# Altium schematic symbol library Altium_Lib.SchLib: 403 symbols (part 3 of 4) (continued)
## NUP4202W1T2G (continued)
TVS DIODE 5VWM 14.5VC SOT363; Manufacturer: ON Semiconductor; Capacitance @ Frequency: 3pF @ 1MHz; Voltage - Reverse Standoff (Typ): 5V (Max); Voltage - Breakdown (Min): 6V; Power Line Protection: No; Current - Peak Pulse (10/1000µs): 28A (8/20µs); Power - Peak Pulse: 500W; Voltage - Clamping (Max) @ Ipp: 14.5V (Typ); Type: Steering (Rail to Rail); Operating Temperature: -40°C ~ 125°C (TJ); Supplier: Digi-Key; Applications: General Purpose; Manufacturer Part Number: NUP4202W1T2G; Packaging: Cut Tape (CT); Package / Case: 6-TSSOP, SC-88, SOT-363; Mounting Type: Surface Mount; RoHS: RoHS Compliant; Category: Circuit Protection; Supplier Device Package: SC-88/SC70-6/SOT-363; Part Status: Active; ComponentLink1URL: http://www.onsemi.com/pub_link/Collateral/NUP4202W1-D.PDF; ComponentLink1Description: http://www.onsemi.com/pub_link/Collateral/NUP4202W1-D.PDF; Pricing: 1=0.69, 10=0.595, 100=0.4441, 500=0.34896, 1000=0.26965 (USD); Stock: 8683; Supplier Part Number: NUP4202W1T2GOSCT-ND
footprint SOT-363
pins: 1, 2, 3, 4, 5, 6

## NX4024T032
designator D?
Generic 3.2" HMI LCD Touch Display 4MB Flash; Manufacturer: Nextion; Manufacturer Part Number: NX4024T032
footprint NX4024T032

## PAD_Inductor_2X_3mmX1mm
designator P?, comment Inductor_Pad  (no BOM)
Inductor Solder pad 2x 1mm X 3mm; Manufacturer: *; Manufacturer Part Number: *; Mounting Type: Surface Mount
footprint PAD_Inductor_2X_3mmX1mm
pins: 1, 2

## PAD_Inductor_2X_5mmx1.75mm
designator P?, comment Inductor_Pad  (no BOM)
Inductor Solder pad 2X 50mmX33mm,; Manufacturer: *; Manufacturer Part Number: *; Mounting Type: Surface Mount
footprint PAD_Inductor_2X_5mmx1.75mm
pins: 1, 2

## PCA9517DP,118
designator U?
IC REDRIVER I2C 1CH 8TSSOP; Manufacturer: NXP USA Inc.; Output: 2-Wire Bus; Number of Channels: 2; Current - Supply: 5mA; Data Rate (Max): 400kHz; Voltage - Supply: 2.7 V ~ 5.5 V; Operating Temperature: -40°C ~ 85°C; Package / Case: 8-TSSOP, 8-MSOP (0.118", 3.00mm Width); Category: Integrated Circuits (ICs); Type: Buffer, ReDriver; Base Part Number: PCA9517; Manufacturer Part Number: PCA9517DP,118; Applications: I²C; Input: 2-Wire Bus; Supplier Device Package: 8-TSSOP; Packaging: Cut Tape (CT); Part Status: Active; Delay Time: -; Supplier: Digi-Key; Signal Conditioning: -; RoHS: RoHS Compliant; ComponentLink1URL: https://www.nxp.com/docs/en/data-sheet/PCA9517.pdf; ComponentLink1Description: https://www.nxp.com/docs/en/data-sheet/PCA9517.pdf; Pricing: 1=1.4, 10=1.265, 100=1.008, 500=0.8499, 1000=0.6918 (USD); Supplier Part Number: 568-1829-1-ND
footprint TSSOP-8
pins: 1 VCCA (power) "A-side supplyVoltage (0.9V to 5.5V)", 2 SCLA (io) "Serial clock bus, A side. Connect to VCCA  through a pullup resistor.", 3 SDAA (io) "Serial data bus, A side. Connect to VCCA  through a pullup resistor.", 4 GND (power) "Supply ground", 5 EN (in) "Active-high repeater enable input", 6 SDAB (io) "Serial data bus, B side. Connect toVCBB   through a pullup resistor.", 7 SCLB (io) "Serial clock bus, B side. Connect to VCCB through a pullup resistor.", 8 VCCB (power) "B-side and device supplyVoltage (2.7V to 5.5V)"

## PCA9617ADPJ
designator U?
IC REDRIVER I2C 1CH 1MHZ 8TSSOP; Manufacturer: NXP USA Inc.; Input: 2-Wire Bus; Number of Channels: 1; Voltage - Supply: 2.7 V ~ 5.5 V; Current - Supply: 8µA; Supplier 1: Digi-Key; Manufacturer Part Number: PCA9617ADPJ; RoHS: RoHS Compliant; Category: Integrated Circuits (ICs); Stock 1: 12305; Pricing 1: 1=1.12, 10=1.003, 100=0.782, 500=0.64596, 1000=0.50997 (USD); Packaging: Cut Tape (CT); Part Status: Active; Type: Buffer, ReDriver; Applications: I²C; Output: 2-Wire Bus; Data Rate (Max): 1MHz; Delay Time: -; Signal Conditioning: -; Operating Temperature: -40°C ~ 85°C; Package / Case: 8-TSSOP, 8-MSOP (0.118", 3.00mm Width); Supplier Device Package: 8-TSSOP; Base Part Number: PCA9617; ComponentLink1URL: https://www.nxp.com/docs/en/data-sheet/PCA9617A.pdf; ComponentLink1Description: https://www.nxp.com/docs/en/data-sheet/PCA9617A.pdf; Supplier Part Number 1: 568-10211-1-ND
footprint TSSOP-8 - S
pins: 1 VCCA (power) "A-side supplyVoltage (0.9V to 5.5V)", 2 SCLA (io) "Serial clock bus, A side. Connect to VCCA  through a pullup resistor.", 3 SDAA (io) "Serial data bus, A side. Connect to VCCA  through a pullup resistor.", 4 GND (power) "Supply ground", 5 EN (in) "Active-high repeater enable input", 6 SDAB (io) "Serial data bus, B side. Connect toVCBB   through a pullup resistor.", 7 SCLB (io) "Serial clock bus, B side. Connect to VCCB through a pullup resistor.", 8 VCCB (power) "B-side and device supplyVoltage (2.7V to 5.5V)"

## PCT2075GV/P110X
designator U?
IC SENSOR TEMP I2C/SMBUS 6TSOP; Manufacturer: NXP USA Inc.; Sensor Type: Digital, Local; Sensing Temperature - Local: -55°C ~ 125°C; Output Type: I²C/SMBus; Voltage - Supply: 2.7 V ~ 5.5 V; Resolution: 11 b; Accuracy - Highest (Lowest): ±1°C (±2°C); Test Condition: -25°C ~ 100°C (-55°C ~ 125°C); Manufacturer Part Number: PCT2075GV/P110X; Category: Sensors, Transducers; Supplier: Digi-Key; RoHS: RoHS Compliant; Packaging: Tape & Reel (TR); Part Status: Active; Sensing Temperature - Remote: -; Features: Output Switch, Programmable Limit, Shutdown Mode; Operating Temperature: -55°C ~ 125°C; Mounting Type: Surface Mount; Package / Case: SC-74, SOT-457; Supplier Device Package: 6-TSOP; ComponentLink1URL: http://www.nxp.com/documents/data_sheet/PCT2075.pdf; ComponentLink1Description: http://www.nxp.com/documents/data_sheet/PCT2075.pdf; Pricing: 3000=0.261, 6000=0.243, 15000=0.2394 (USD); Supplier Part Number: 568-13081-2-ND
footprint TSOP-6 (SOT-23/SC-74A; 5 Leads; Body 3 x 3 mm, inc. leads (LxW max))
pins: 1 A0, 2 GND, 3 VCC, 4 SCL, 5 OS, 6 SDA

## PCT2075GVX
designator U?
IC SENSOR TEMP I2C/SMBUS 6TSOP; Manufacturer: NXP USA Inc.; Sensor Type: Digital, Local; Sensing Temperature - Local: -55°C ~ 125°C; Output Type: I²C/SMBus; Voltage - Supply: 2.7 V ~ 5.5 V; Resolution: 11 b; Accuracy - Highest (Lowest): ±1°C (±2°C); Test Condition: -25°C ~ 100°C (-55°C ~ 125°C); Manufacturer Part Number: PCT2075GVX; Category: Sensors, Transducers; Supplier: Digi-Key; RoHS: RoHS Compliant; Packaging: Tape & Reel (TR); Part Status: Active; Sensing Temperature - Remote: -; Features: Output Switch, Programmable Limit, Shutdown Mode; Operating Temperature: -55°C ~ 125°C; Mounting Type: Surface Mount; Package / Case: SC-74, SOT-457; Supplier Device Package: 6-TSOP; ComponentLink1URL: http://www.nxp.com/documents/data_sheet/PCT2075.pdf; ComponentLink1Description: http://www.nxp.com/documents/data_sheet/PCT2075.pdf; Pricing: 3000=0.261, 6000=0.243, 15000=0.2394 (USD); Supplier Part Number: 568-13081-2-ND
footprint TSOP-6 (SOT-23/SC-74A; 5 Leads; Body 3 x 3 mm, inc. leads (LxW max))
pins: 1 A0, 2 GND, 3 VCC, 4 SCL, 5 OS, 6 SDA

## PDI018A0P-SE3
designator U?
The PDI018A0P-SE3  is a small-size 1.77” TFT with 128 x 160  resolution; Manufacturer: Phoenix Display International, Inc; Manufacturer Part Number: PDI018A0P-SE3; ComponentLink1Description: http://www.phoenixdisplay.com/wp-content/uploads/2015/07/PDI018A0P-SE3.pdf
footprint PDI018A0P-SE3
pins: 1 GND, 2 GND, 3 NC, 4 GND, 5 IOVCC, 6 RST, 7 RS, 8 SCL, 9 SDI, 10 CS, 11 GND, 12 VDD, 13 LED_A, 14 LED_K1, 15 LED_K2, 16 GND

## PDTC143ZT,235
designator Q?
TRANS PREBIAS NPN 250MW TO236AB; Manufacturer: Nexperia USA Inc.; Transistor Type: NPN - Pre-Biased; Current - Collector (Ic) (Max): 100mA; Voltage - Collector Emitter Breakdown (Max): 50V; Resistor - Base (R1) (Ohms): 4.7k; Resistor - Emitter Base (R2) (Ohms): 47k; DC Current Gain (hFE) (Min) @ Ic, Vce: 100 @ 10mA, 5V; Vce Saturation (Max) @ Ib, Ic: 100mV @ 250µA, 5mA; Current - Collector Cutoff (Max): 1µA; Frequency - Transition: 230MHz; Manufacturer Part Number: PDTC143ZT,235; Category: Discrete Semiconductor Products; Supplier: Digi-Key; RoHS: RoHS Compliant; Packaging: Tape & Reel (TR); Part Status: Active; Power - Max: 250mW; Mounting Type: Surface Mount; Package / Case: TO-236-3, SC-59, SOT-23-3; Supplier Device Package: TO-236AB (SOT23); ComponentLink1URL: http://assets.nexperia.com/documents/data-sheet/PDTC143Z_SER.pdf; ComponentLink1Description: http://assets.nexperia.com/documents/data-sheet/PDTC143Z_SER.pdf; Pricing: 10000=0.02478, 30000=0.0223, 50000=0.01982, 100000=0.01859, 250000=0.01652 (USD); Supplier Part Number: 1727-3045-2-ND
footprint SOT23_L (SOT23, 3-Leads, Body 2.9x1.3mm, Pitch 0.95mm, Lead Span 2.3mm, IPC High Density)
pins: 1 B, 2 E, 3 C
text: 4K7; 47K

## PIC16F1823T-I/SL
designator U?
IC MCU 8BIT 3.5KB FLASH 14SOIC; Manufacturer: Microchip Technology; Oscillator Type: Internal; RAM Size: 128 x 8; Data Converters: A/D 8x10b; Voltage - Supply (Vcc/Vdd): 1.8 V ~ 5.5 V; EEPROM Size: 256 x 8; Connectivity: I²C, LIN, SPI, UART/USART; Core Size: 8-Bit; Speed: 32MHz; Core Processor: PIC; Peripherals: Brown-out Detect/Reset, POR, PWM, WDT; Program Memory Size: 3.5KB (2K x 14); Package / Case: 14-SOIC (0.154", 3.90mm Width); Supplier Device Package: 14-SOIC; Operating Temperature: -40°C ~ 85°C (TA); Supplier: Digi-Key; Category: Integrated Circuits (ICs); Part Status: Active; Program Memory Type: FLASH; Manufacturer Part Number: PIC16F1823T-I/SL; Packaging: Tape & Reel (TR); RoHS: RoHS Compliant; ComponentLink1URL: http://www.microchip.com/mymicrochip/filehandler.aspx?ddocname=en547368; ComponentLink1Description: http://www.microchip.com/mymicrochip/filehandler.aspx?ddocname=en547368; Pricing: 2600=0.987 (USD); Supplier Part Number: PIC16F1823T-I/SLTR-ND
footprint SOIC-14_M (SOIC, 14-Leads, Body 8.7x3.9mm, Pitch 1.27mm, IPC Low Density)
pins: 1 VDD, 2 RA5/T1CKI/OSC1/CLKIN, 3 RA4/AN3/T1G/OSC2/CLKOUT, 4 RA3/MCLR/VPP, 5 RC5/CCP1/P1A, 6 RC4/C2OUT/P1B, 7 RC3/AN7/C12IN3, 8 RC2/AN6/C12IN2-/P1d, 9 RC1/AN5/C12IN1-, 10 RC0/AN4/C2IN+, 11 RA2/AN2/TOCKI/INT/C1OUT, 12 RA1/AN1/C12IN0-/VREF/ICSPCLK, 13 RA0/AN0/C1IN+/ISCPDAT, 14 VSS

## PIC16F18323-E/SL
designator U?
IC MCU 8BIT 3.5KB FLASH 14SOIC; Manufacturer: Microchip Technology; Speed: 32MHz; Core Processor: PIC; Connectivity: I²C, LIN, SPI, UART/USART; Peripherals: Brown-out Detect/Reset, POR, PWM, WDT; Core Size: 8-Bit; Voltage - Supply (Vcc/Vdd): 2.3 V ~ 5.5 V; RAM Size: 256 x 8; Program Memory Size: 3.5KB (2K x 14); Oscillator Type: Internal; Data Converters: A/D 11x10b, D/A 1x5b; Number of I/O: 12; RoHS: RoHS Compliant; Part Status: Active; Packaging: Tube; Operating Temperature: -40°C ~ 125°C (TA); Program Memory Type: FLASH; Supplier: Digi-Key; Supplier Device Package: 14-SOIC; Package / Case: 14-SOIC (0.154", 3.90mm Width); Manufacturer Part Number: PIC16F18323-E/SL; EEPROM Size: 256 x 8; Category: Integrated Circuits (ICs); ComponentLink1URL: http://ww1.microchip.com/downloads/en/DeviceDoc/40001744C.pdf; ComponentLink1Description: http://ww1.microchip.com/downloads/en/DeviceDoc/40001744C.pdf; Pricing: 1=0.9, 25=0.824, 100=0.7416 (USD); Supplier Part Number: PIC16F18323-E/SL-ND
footprint SOIC-14_M (SOIC, 14-Leads, Body 8.7x3.9mm, Pitch 1.27mm, IPC Low Density)
pins: 1 VDD, 2 RA5/T1CKI/OSC1/CLKIN, 3 RA4/AN3/T1G/OSC2/CLKOUT, 4 RA3/MCLR/VPP, 5 RC5/CCP1/P1A, 6 RC4/C2OUT/P1B, 7 RC3/AN7/C12IN3, 8 RC2/AN6/C12IN2-/P1d, 9 RC1/AN5/C12IN1-, 10 RC0/AN4/C2IN+, 11 RA2/AN2/TOCKI/INT/C1OUT, 12 RA1/AN1/C12IN0-/VREF/ICSPCLK, 13 RA0/AN0/C1IN+/ISCPDAT, 14 VSS

## PIC16LF18323-I/SL
designator U?
IC MCU 8BIT 3.5KB FLASH 14SOIC; Manufacturer: Microchip Technology; Connectivity: I²C, LIN, SPI, UART/USART; RAM Size: 256 x 8; Speed: 32MHz; Voltage - Supply (Vcc/Vdd): 1.8 V ~ 3.6 V; Data Converters: A/D 11x10b, D/A 1x5b; Peripherals: Brown-out Detect/Reset, POR, PWM, WDT; Oscillator Type: Internal; Program Memory Size: 3.5KB (2K x 14); Core Processor: PIC; Core Size: 8-Bit; Package / Case: 14-SOIC (0.154", 3.90mm Width); Supplier Device Package: 14-SOIC; Program Memory Type: FLASH; EEPROM Size: 256 x 8; Operating Temperature: -40°C ~ 85°C (TA); RoHS: RoHS Compliant; Supplier: Digi-Key; Part Status: Active; Packaging: Tube; Category: Integrated Circuits (ICs); Manufacturer Part Number: PIC16LF18323-I/SL; ComponentLink1URL: http://ww1.microchip.com/downloads/en/DeviceDoc/40001744C.pdf; ComponentLink1Description: http://ww1.microchip.com/downloads/en/DeviceDoc/40001744C.pdf; Pricing: 1=0.83, 25=0.756, 100=0.693 (USD); Supplier Part Number: PIC16LF18323-I/SL-ND
footprint SOIC-14_M (SOIC, 14-Leads, Body 8.7x3.9mm, Pitch 1.27mm, IPC Low Density)
pins: 1 VDD, 2 RA5/T1CKI/OSC1/CLKIN, 3 RA4/AN3/T1G/OSC2/CLKOUT, 4 RA3/MCLR/VPP, 5 RC5/CCP1/P1A, 6 RC4/C2OUT/P1B, 7 RC3/AN7/C12IN3, 8 RC2/AN6/C12IN2-/P1d, 9 RC1/AN5/C12IN1-, 10 RC0/AN4/C2IN+, 11 RA2/AN2/TOCKI/INT/C1OUT, 12 RA1/AN1/C12IN0-/VREF/ICSPCLK, 13 RA0/AN0/C1IN+/ISCPDAT, 14 VSS

## PIC18F1320-I/SS
designator U?
IC MCU 8BIT 8KB FLASH 20SSOP; Manufacturer: Microchip Technology; Data RAM Size: 256 B; Data ROM Type: EEPROM; Interface Type: EUSART; Number of I/Os: 16 I/O; ADC Resolution: 10 bit; Core: PIC; Maximum Clock Frequency: 40 MHz; Number of ADC Channels: 7 Channel; Number of Timers/Counters: 1 Timer; Operating Supply Voltage: 2 V to 5.5 V; Processor Series: PIC18; Supply Voltage - Max: 5.5 V; Supply Voltage - Min: 4.2 V; Supplier 1: Mouser; Manufacturer Part Number: PIC18F1320-I/SS; RoHS: RoHS Compliant; Category: 8-bit Microcontrollers - MCU; Stock 1: 243; Pricing 1: 1=2.95 (USD); Height: 1.75 mm; Length: 7.2 mm; Package / Case: SSOP-20; Packaging: Tube; Program Memory Type: Flash; Series: PIC18(L)F1x20; Width: 5.3 mm; Brand: Microchip Technology; Data ROM Size: 256 B; Mounting Style: SMD/SMT; Program Memory Size: 8 kB; Data Bus Width: 8 bit; Maximum Operating Temperature: + 85 C; Minimum Operating Temperature: - 40 C; Product Type: 8-bit Microcontrollers - MCU; Standard Pack Qty: 67; Subcategory: Microcontrollers - MCU; Tradename: PIC; RoHS - Mouser: Y; Minimum Order Quantity: 1; Reeling: False; ComponentLink1URL: https://www.mouser.com/datasheet/2/268/30009605G-1074158.pdf; ComponentLink1Description: https://www.mouser.com/datasheet/2/268/30009605G-1074158.pdf; Supplier Part Number 1: 579-PIC18F1320-I/SS
footprint SSOP20
pins: 1 RA0/AN0, 2 RA1/AN1/LVDIN, 3 RA4/TOCKI, 4 MCLR/VPP/RA5, 5 VSS, 6 AVSS, 7 RA2/AN3/VREF-, 8 RA3/AN3/VREF+, 9 RB0/AN4/INT0, 10 RB1/AN5/TX/CK/INT1, 11 RB4/AN6/RX/DT/KBIO, 12 RB5/PGM/KBI1, 13 RB6/PGC/T1OSO, 14 RB7/PGD/T1oSI, 15 AVDD, 16 VDD, 17 OSC2/CLKO/RA6, 18 OSC1/CLKI/RA7, 19 RB2/P1B/INT2, 20 RB3/CCP1/P1A

## PIC18F2525-I/SO
designator U?
IC MCU 8BIT 48KB FLASH 28SOIC; Manufacturer: Microchip; RAM Size: 3986B; Max Power Dissipation: 1W; Interface: I2C,SPI,UART,USART; Number of I/Os: 25; Number of Timers/Counters: 4; Min Supply Voltage: 4.2V; Max Supply Voltage: 5.5V; Number of PWM Channels: 2; Number of ADC Channels: 10; Frequency: 40MHz; Number of UART Channels: 1; Data Bus Width: 8b; Number of Bits: 8; Oscillator Type: Internal; Watchdog Timer: Yes; Access Time: 40us; Peripherals: PWM,I2C,Brown-out Detect/Reset,POR,WDT,HLVD; Core Architecture: PIC; Nominal Supply Current: 1.1mA; Supplier 1: Digi-Key; Manufacturer Part Number: PIC18F2525-I/SO; Stock 1: 391; Pricing 1: 1=5.21 (USD); Mount: Surface Mount; Case/Package: SOIC; Number of Pins: 28; Min Operating Temperature: -40°C; Max Operating Temperature: 85°C; Package Quantity: 27; Packaging: Rail/Tube; Density: 48KB; Number of Programmable I/O: 25; Memory Type: FLASH; Max Frequency: 40MHz; Number of SPI Channels: 1; Number of I2C Channels: 1; Number of A/D Converters: 1; Memory Size: 48KB; Address Bus Width: 8b; Length: 17.9mm; Height: 2.35mm; Width: 7.5mm; Radiation Hardening: No; REACH SVHC: No SVHC; Lead Free: Lead Free; ComponentLink1URL: http://www.microchip.com/mymicrochip/filehandler.aspx?ddocname=en533963&src-supplier=Digi-Key; ComponentLink1Description: http://www.microchip.com/mymicrochip/filehandler.aspx?ddocname=en533963&src-supplier=Digi-Key; ComponentLink2URL: http://ww1.microchip.com/downloads/en/DeviceDoc/39626e.pdf?src-supplier=Element14; ComponentLink2Description: http://ww1.microchip.com/downloads/en/DeviceDoc/39626e.pdf?src-supplier=Element14; ComponentLink3URL: https://www.distrelec.biz/Web/Downloads/_t/ds/pic18f2525-2620-4525-4620_eng_tds.pdf?mime=application%2Fpdf&src-supplier=Distrelec; ComponentLink3Description: https://www.distrelec.biz/Web/Downloads/_t/ds/pic18f2525-2620-4525-4620_eng_tds.pdf?mime=application%2Fpdf&src-supplier=Distrelec; ComponentLink4URL: http://www.produktinfo.conrad.com/datenblaetter/650000-674999/651675-da-01-en-IC_MCU_PIC18F2525_I_SO_SOIC_28_MCP.pdf?src-supplier=Conrad; ComponentLink4Description: http://www.produktinfo.conrad.com/datenblaetter/650000-674999/651675-da-01-en-IC_MCU_PIC18F2525_I_SO_SOIC_28_MCP.pdf?src-supplier=Conrad; ComponentLink5URL: http://datasheet.iiic.cc/microchip_technology/PIC18F2525-I_SO.pdf?src-supplier=IIIC; ComponentLink5Description: http://datasheet.iiic.cc/microchip_technology/PIC18F2525-I_SO.pdf?src-supplier=IIIC; Supplier Part Number 1: PIC18F2525-I/SO-ND
footprint SOIC-28 (SO28L)
pins: 1 MCLR/VPP/RE3, 2 RA0/AN0, 3 RA1/AN1, 4 RA2/AN2/VREF-/CVREF, 5 RA3/AN3/VREF+, 6 RA4/T0CKI/C1OUT, 7 RA5/AN4/SS/HLVDIN/C2OUT, 8 VSS, 9 RA7/OSC1/CLKI, 10 RA6/OSC2/CLKO, 11 RC0/T1OSO/T13CKI, 12 RC1/T1OSI/CCP2, 13 RC2/CCP1, 14 RC3/SCK/SCL, 15 RC4/SDI/SDA, 16 RC5/SDO, 17 RC6/TX/CK, 18 RC7/RX/DT, 19 VSS, 20 VDD, 21 RB0/INT0/FLT0/AN12, 22 RB1/INT1/AN10, 23 RB2/INT2/AN8, 24 RB3/AN9/CCP2, 25 RB4/KBI0/AN11, 26 RB5/KBI1/PGM, 27 RB6/KBI2/PGC, 28 RB7/KBI3/PGD

## Potentiometers__3314J-1-103E
designator R?, comment 10k
TRIMMER 10K OHM 0.25W SMD; Manufacturer Part Number: 3314J-1-103E; Manufacturer: Bourns Inc.; Power (Watts): 0.25W, 1/4W; Tolerance: ±20%; Temperature Coefficient: ±100ppm/°C; Number of Turns: 1; Adjustment Type: Top Adjustment; Resistive Material: Cermet; Category: Potentiometers, Variable Resistors; Supplier: Digi-Key; RoHS: RoHS Compliant; Packaging: Tape & Reel (TR); Part Status: Active; Mounting Type: Surface Mount; Termination Style: J Lead; Size / Dimension: Square - 0.177" x 0.177" Face x 0.100" H (4.50mm x 4.50mm x 2.55mm); ComponentLink1URL: http://www.bourns.com/docs/Product-Datasheets/3314.pdf; ComponentLink1Description: http://www.bourns.com/docs/Product-Datasheets/3314.pdf; Pricing: 500=1.14, 1000=1.08, 2500=0.93, 5000=0.9 (USD); Supplier Part Number: 3314J-103ETR-ND; Resistance: 10k
footprint POT_3314
pins: 1 TOP, 2 TAP, 3 BOT

## Potentiometers__PVG3A103C01R00
designator R?, comment 10k
TRIMMER 10K OHM 0.25W SMD; Manufacturer Part Number: PVG3A103C01R00; Manufacturer: Bourns Inc.; Resistive Material: Cermet; Number of Turns: 1; Adjustment Type: Top Adjustment; Power (Watts): 0.25W, 1/4W; Tolerance: ±20%; Temperature Coefficient: ±150ppm/°C; Termination Style: J Lead; Size / Dimension: Rectangular - 0.142" x 0.134" Face x 0.079" H (3.60mm x 3.40mm x 2.00mm); Mounting Type: Surface Mount; Supplier: Digi-Key; Category: Potentiometers, Variable Resistors; Part Status: Active; Resistance: 10k; RoHS: RoHS Compliant; Packaging: Tape & Reel (TR); ComponentLink1URL: http://www.bourns.com/docs/Product-Datasheets/pvg3.pdf; ComponentLink1Description: http://www.bourns.com/docs/Product-Datasheets/pvg3.pdf; Supplier Part Number: 490-2644-2-ND
footprint POT_PGV3A
pins: 1 TOP, 2 TAP, 3 BOT

## PTC__0ZCF0185FF2C
designator P?, comment 0ZCF0185FF2C
PTC RESET FUSE 33V 1.85A 2920; Manufacturer: Bel Fuse Inc.; Approvals: cURus, TUV; Height - Seated (Max): -; Thickness (Max): 0.035" (0.90mm); Lead Spacing: -; Size / Dimension: 0.290" L x 0.202" W (7.36mm x 5.12mm); Package / Case: 2920 (7351 Metric), Concave; Mounting Type: Surface Mount; Manufacturer Part Number: 0ZCF0185FF2C; Operating Temperature: -40°C ~ 85°C; Ratings: -; Packaging: Tape & Reel (TR); Supplier: Digi-Key; RoHS: RoHS Compliant; Part Status: Active; Voltage - Max: 33V; Type: Polymeric; Category: Circuit Protection; ComponentLink1URL: https://belfuse.com/resources/CircuitProtection/datasheets/0ZCF%20Nov2016.pdf; ComponentLink1Description: https://belfuse.com/resources/CircuitProtection/datasheets/0ZCF%20Nov2016.pdf; Pricing: 2000=0.12342, 4000=0.11616, 6000=0.1089, 10000=0.10164 (USD); Supplier Part Number: 507-1747-2-ND
footprint PTC-2920 (Chip Resistor; Body 2.0 x 1.3 mm (LxW typ))
pins: 1, 2

## PTC__0ZCJ0005FF2E
designator P?, comment 0ZCJ0005FF2E
PTC RESTTBLE 0.05A 60V CHIP 1206; Manufacturer: Bel Fuse Inc.; Resistance - Post Trip (R1) (Max): 50 Ohm; Time to Trip: 1.5s; Resistance - Initial (Ri) (Min): 3.6 Ohm; Approvals: cURus, TUV; Current - Max: 10A; Mounting Type: Surface Mount; Ratings: -; Height - Seated (Max): -; Size / Dimension: 0.128" L x 0.065" W (3.25mm x 1.65mm); Lead Spacing: -; Thickness (Max): 0.033" (0.85mm); Operating Temperature: -40°C ~ 85°C; Package / Case: 1206 (3216 Metric), Concave; Resistance - 25°C (Typ): -; Part Status: Active; Packaging: Tape & Reel (TR); RoHS: RoHS Compliant; Category: Circuit Protection; Type: Polymeric; Manufacturer Part Number: 0ZCJ0005FF2E; Voltage - Max: 60V; Supplier: Digi-Key; ComponentLink1URL: http://www.belfuse.com/pdfs/0ZCJ.pdf; ComponentLink1Description: http://www.belfuse.com/pdfs/0ZCJ.pdf; Pricing: 3000=0.05632, 6000=0.0528, 15000=0.04928 (USD); Supplier Part Number: 507-1793-2-ND
footprint PTC-1206
pins: 1, 2

## PTC__0ZCJ0035AF2E
designator P?, comment 0ZCJ0035AF2E
PTC RESET FUSE 30V 350MA 1206; Manufacturer: Bel Fuse Inc.; Approvals: cURus, TUV; Manufacturer Part Number: 0ZCJ0035AF2E; Category: Circuit Protection; Supplier: Digi-Key; RoHS: RoHS Compliant; Packaging: Tape & Reel (TR); Part Status: Active; Type: Polymeric; Voltage - Max: 30V; Operating Temperature: -40°C ~ 85°C; Ratings: -; Mounting Type: Surface Mount; Package / Case: 1206 (3216 Metric), Concave; Size / Dimension: 0.128" L x 0.065" W (3.25mm x 1.65mm); Height - Seated (Max): -; Thickness (Max): 0.051" (1.30mm); Lead Spacing: -; ComponentLink1URL: https://www.belfuse.com/resources/CircuitProtection/datasheets/0ZCJ%20Nov2016.pdf; ComponentLink1Description: https://www.belfuse.com/resources/CircuitProtection/datasheets/0ZCJ%20Nov2016.pdf; Pricing: 3000=0.08624, 6000=0.08085, 15000=0.07546 (USD); Supplier Part Number: 507-1801-2-ND
footprint PTC-1206
pins: 1, 2

## PTC__1206L016WR
designator P?, comment 1206L016WR
PTC RESET 30V .160A SMD 1206; Manufacturer: Littelfuse Inc.; Resistance - Post Trip (R1) (Max): 4.5 Ohm; Resistance - Initial (Ri) (Min): 1.2 Ohm; Time to Trip: 300ms; Approvals: cURus, TUV; Current - Max: 100A; Packaging: Tape & Reel (TR); Part Status: Active; Voltage - Max: 30V; Lead Spacing: -; Thickness (Max): 0.057" (1.45mm); Height - Seated (Max): -; Size / Dimension: 0.126" L x 0.065" W (3.20mm x 1.65mm); Package / Case: 1206 (3216 Metric), Concave, Long Side Terminals; Mounting Type: Surface Mount; Ratings: -; Type: Polymeric; Operating Temperature: -40°C ~ 85°C; Resistance - 25°C (Typ): -; RoHS: RoHS Compliant; Supplier: Digi-Key; Category: Circuit Protection; Manufacturer Part Number: 1206L016WR; ComponentLink1URL: http://www.littelfuse.com/~/media/electronics/datasheets/resettable_ptcs/littelfuse_ptc_1206l_datasheet.pdf.pdf; ComponentLink1Description: http://www.littelfuse.com/~/media/electronics/datasheets/resettable_ptcs/littelfuse_ptc_1206l_datasheet.pdf.pdf; Pricing: 3000=0.18838, 6000=0.18495, 15000=0.1781 (USD); Supplier Part Number: F3132TR-ND
footprint PTC-1206
pins: 1, 2

## PTC__1206L035/30WR
designator P?, comment 1206L035/30WR
PTC 30V POLYFUSE SURF MOUNT 1206; Manufacturer: Littelfuse Inc.; Part Status: Active; RoHS: RoHS Compliant; Manufacturer Part Number: 1206L035/30WR; Category: Uncategorized; Supplier: Digi-Key; ComponentLink1URL: http://www.littelfuse.com/~/media/electronics/datasheets/resettable_ptcs/littelfuse_ptc_1206l_datasheet.pdf.pdf; ComponentLink1Description: http://www.littelfuse.com/~/media/electronics/datasheets/resettable_ptcs/littelfuse_ptc_1206l_datasheet.pdf.pdf; Supplier Part Number: F8473TR-ND
footprint PTC-1206
pins: 1, 2

## PTC__1812L035/30DR
designator P?, comment 1812L035/30DR
PTC RESET FUSE 30V 350MA 1812; Manufacturer: Littelfuse Inc.; Approvals: cURus, TUV; Mounting Type: Surface Mount; Ratings: -; Operating Temperature: -40°C ~ 85°C; Manufacturer Part Number: 1812L035/30DR; Category: Circuit Protection; Packaging: Tape & Reel (TR); RoHS: RoHS Compliant; Voltage - Max: 30V; Type: Polymeric; Part Status: Active; Supplier: Digi-Key; Height - Seated (Max): -; Thickness (Max): 0.049" (1.25mm); Lead Spacing: -; Package / Case: 1812 (4532 Metric), Concave; Size / Dimension: 0.179" L x 0.128" W (4.55mm x 3.24mm); ComponentLink1URL: http://www.littelfuse.com/~/media/electronics/datasheets/resettable_ptcs/littelfuse_ptc_1812l_datasheet.pdf.pdf; ComponentLink1Description: http://www.littelfuse.com/~/media/electronics/datasheets/resettable_ptcs/littelfuse_ptc_1812l_datasheet.pdf.pdf; Pricing: 1500=0.77687, 3000=0.7345, 7500=0.70625 (USD); Supplier Part Number: F4158TR-ND
footprint PTC-1812 (Chip Resistor; Body 2.0 x 1.3 mm (LxW typ))
pins: 1, 2

## PTC__1812L050/30PR
designator P?, comment 1812L050/30PR
PTC RESET FUSE 30V 500MA 1812; Manufacturer: Littelfuse Inc.; Approvals: cURus, TUV; Manufacturer Part Number: 1812L050/30PR; RoHS: RoHS Compliant; Package / Case: 1812 (4532 Metric), Concave; Mounting Type: Surface Mount; Type: Polymeric; Packaging: Cut Tape (CT); Lead Spacing: -; Voltage - Max: 30V; Thickness (Max): 0.039" (1.00mm); Size / Dimension: 0.179" L x 0.128" W (4.55mm x 3.24mm); Supplier: Digi-Key; Ratings: -; Operating Temperature: -40°C ~ 85°C; Category: Circuit Protection; Part Status: Active; Height - Seated (Max): -; ComponentLink1URL: http://www.littelfuse.com/~/media/electronics/datasheets/resettable_ptcs/littelfuse_ptc_1812l_datasheet.pdf.pdf; ComponentLink1Description: http://www.littelfuse.com/~/media/electronics/datasheets/resettable_ptcs/littelfuse_ptc_1812l_datasheet.pdf.pdf; Pricing: 1=1, 5=0.972, 10=0.909, 50=0.7524, 100=0.627, 250=0.61132, 500=0.51728, 1000=0.45458 (USD); Supplier Part Number: F4159CT-ND
footprint PTC-1812 (Chip Resistor; Body 2.0 x 1.3 mm (LxW typ))
pins: 1, 2

## PTC__1812L075/33DR
designator P?, comment 1812L075/33DR
PTC RESET FUSE 33V 750MA 1812; Manufacturer: Littelfuse Inc.; Approvals: cURus, TUV; Manufacturer Part Number: 1812L075/33DR; Category: Circuit Protection; Supplier: Digi-Key; Type: Polymeric; Voltage - Max: 33V; Operating Temperature: -40°C ~ 85°C; Ratings: -; RoHS: RoHS Compliant; Packaging: Tape & Reel (TR); Part Status: Active; Lead Spacing: -; Size / Dimension: 0.179" L x 0.128" W (4.55mm x 3.24mm); Mounting Type: Surface Mount; Package / Case: 1812 (4532 Metric), Concave; Height - Seated (Max): -; Thickness (Max): 0.061" (1.55mm); ComponentLink1URL: http://www.littelfuse.com/~/media/electronics/datasheets/resettable_ptcs/littelfuse_ptc_1812l_datasheet.pdf.pdf; ComponentLink1Description: http://www.littelfuse.com/~/media/electronics/datasheets/resettable_ptcs/littelfuse_ptc_1812l_datasheet.pdf.pdf; Pricing: 1500=0.25955, 3000=0.24613, 7500=0.24165, 10500=0.2327 (USD); Supplier Part Number: F3355TR-ND
footprint PTC-1812 (Chip Resistor; Body 2.0 x 1.3 mm (LxW typ))
pins: 1, 2

## PTC__1812L075PR
designator P?, comment 1812L075PR
PTC .75A 13.2V RESETTABLE 1812L; Manufacturer: Littelfuse Inc.; Current - Max: 100A; Current - Trip (It): 1.5A; R Min/Max: 0.100 ~ 0.450 Ohm; Time to Trip: 0.2s; Category: Circuit Protection; Height - Seated (Max): -; Lead Spacing: -; Manufacturer Part Number: 1812L075PR; Mounting Type: Surface Mount; Package / Case: 1812 (4532 Metric), Concave; Packaging: Tape & Reel (TR); Part Status: Active; RoHS: RoHS Compliant; Size / Dimension: 0.179" L x 0.128" W (4.55mm x 3.24mm); Supplier: Digi-Key; Thickness (Max): 0.030" (0.75mm); Voltage - Max: 13.2V; ComponentLink1URL: http://www.littelfuse.com/~/media/electronics/datasheets/resettable_ptcs/littelfuse_ptc_1812l_datasheet.pdf.pdf; ComponentLink1Description: http://www.littelfuse.com/~/media/electronics/datasheets/resettable_ptcs/littelfuse_ptc_1812l_datasheet.pdf.pdf; Pricing: 2000=0.2002, 4000=0.19663, 6000=0.19305, 10000=0.1859 (USD); Supplier Part Number: F2151TR-ND
footprint PTC-1812 (Chip Resistor; Body 2.0 x 1.3 mm (LxW typ))
pins: 1, 2

## PUMH10,115
designator Q?
TRANS 2NPN PREBIAS 0.3W 6TSSOP; Manufacturer: Nexperia USA Inc.; Transistor Type: 2 NPN - Pre-Biased (Dual); Resistor - Emitter Base (R2) (Ohms): 47k; Vce Saturation (Max) @ Ib, Ic: 100mV @ 250µA, 5mA; DC Current Gain (hFE) (Min) @ Ic, Vce: 100 @ 10mA, 5V; Voltage - Collector Emitter Breakdown (Max): 50V; Current - Collector (Ic) (Max): 100mA; Resistor - Base (R1) (Ohms): 2.2k; Power - Max: 300mW; Current - Collector Cutoff (Max): 1µA; Package / Case: 6-TSSOP, SC-88, SOT-363; Supplier Device Package: 6-TSSOP; Manufacturer Part Number: PUMH10,115; Category: Discrete Semiconductor Products; Mounting Type: Surface Mount; Part Status: Active; RoHS: RoHS Compliant; Supplier: Digi-Key; Packaging: Cut Tape (CT); Frequency - Transition: -; ComponentLink1URL: http://assets.nexperia.com/documents/data-sheet/PEMH10_PUMH10.pdf; ComponentLink1Description: http://assets.nexperia.com/documents/data-sheet/PEMH10_PUMH10.pdf; Supplier Part Number: 1727-5235-1-ND
footprint SOT-363
part A pins: 1 E1, 2 B1, 6 C1
part B pins: 3 C2, 4 E2, 5 B2
part A text: 2K2; 47K
part B text: 2K2; 47K

## RELAY__EE2-5NU-L
designator K?, comment EE2-5NU-L
RELAY GEN PURPOSE DPDT 2A 5V; Manufacturer: KEMET; Relay Type: General Purpose; Coil Type: Non Latching; Contact Form: DPDT (2 Form C); Coil Voltage: 5VDC; Coil Resistance: 178 Ohms; Turn On Voltage (Max): 3.75 VDC; Turn Off Voltage (Min): 0.5 VDC; Switching Voltage: 250VAC, 220VDC - Max; Coil Power: 140 mW; Part Status: Active; Packaging: Tape & Reel (TR); Category: Relays; Manufacturer Part Number: EE2-5NU-L; RoHS: RoHS Compliant; Supplier: Digi-Key; Contact Material: Silver Alloy, Gold Alloy; Features: -; Operating Temperature: -40°C ~ 85°C; Mounting Type: Surface Mount; Termination Style: Gull Wing; ComponentLink1URL: http://www.kemet.com/Lists/ProductCatalog/Attachments/479/KEM_R7002_EC2_EE2.pdf; ComponentLink1Description: http://www.kemet.com/Lists/ProductCatalog/Attachments/479/KEM_R7002_EC2_EE2.pdf; Pricing: 500=1.08, 1000=1.008, 2500=0.99, 5000=0.972 (USD); Supplier Part Number: 399-11017-2-ND
footprint RELAY__2.54/5.08
pins: 1, 2, 3, 4, 5, 6, 7, 8

## RELAY__G2RL-1A-E DC5
designator K?, comment G2RL-1A-E DC5
RELAY GEN PURPOSE SPST 16A 5V; Manufacturer: Omron Electronics Inc-EMC Div; Contact Form: SPST-NO (1 Form A); Turn Off Voltage (Min): 0.5 VDC; Turn On Voltage (Max): 3.5 VDC; Relay Type: General Purpose; Coil Voltage: 5VDC; Coil Type: Non Latching; Switching Voltage: 440VAC, 300VDC - Max; Coil Power: 400 mW; Features: Insulation - Class F, Sealed - Flux Protection; Manufacturer Part Number: G2RL-1A-E DC5; Part Status: Active; Contact Material: Silver Alloy, Cadmium Free; Termination Style: PC Pin; Operating Temperature: -40°C ~ 85°C; RoHS: RoHS Compliant; Supplier: Digi-Key; Category: Relays; Mounting Type: Through Hole; Packaging: Tube; ComponentLink1URL: http://omronfs.omron.com/en_US/ecb/products/pdf/en-g2rl.pdf; ComponentLink1Description: http://omronfs.omron.com/en_US/ecb/products/pdf/en-g2rl.pdf; Pricing: 1=2.81, 10=2.631, 25=2.3384, 50=2.2214, 100=2.1046, 250=1.87072, 500=1.7538 (USD); Supplier Part Number: Z5209-ND
footprint RELAY_G2RL-1A-E
pins: 1 T1, 3 COM, 4 NO, 5 NO, 6 NO, 8 T2

## RELAY__G2RL-2 DC5
designator K?, comment G2RL-2-CF DC5
RELAY GENERAL PURPOSE DPDT 8A 5V; Manufacturer: Omron Electronics Inc-EMC Div; Turn Off Voltage (Min): 0.5 VDC; Turn On Voltage (Max): 3.5 VDC; Coil Power: 400 mW; Contact Form: DPDT (2 Form C); Coil Voltage: 5VDC; Coil Type: Non Latching; Switching Voltage: 440VAC, 300VDC - Max; Manufacturer Part Number: G2RL-2-CF DC5; Category: Relays; Supplier: Digi-Key; Contact Material: Silver Alloy, Cadmium Free; Features: Insulation - Class F, Sealed - Flux Protection; RoHS: RoHS Compliant; Termination Style: PC Pin; Relay Type: General Purpose; Part Status: Obsolete; Packaging: Tube; Mounting Type: Through Hole; Operating Temperature: -40°C ~ 85°C; ComponentLink1URL: https://media.digikey.com/pdf/Data%20Sheets/Omron%20PDFs/G2RL.pdf; ComponentLink1Description: https://media.digikey.com/pdf/Data%20Sheets/Omron%20PDFs/G2RL.pdf; Supplier Part Number: G2RL-2-CF-DC5-ND
footprint RELAY_G2RL
pins: 1 T1, 2 NC_1, 3 COM_1, 4 NO_1, 5 NO_2, 6 COM_2, 7 NC_2, 8 T2

## RELAY__G5Q-1 DC5
designator K?, comment G5Q-1 DC5
RELAY GEN PURPOSE SPDT 10A 5V; Manufacturer: Omron Electronics Inc-EMC Div; Switching Voltage: 277VAC, 30VDC - Max; Turn On Voltage (Max): 3.75 VDC; Relay Type: General Purpose; Contact Form: SPDT (1 Form C); Coil Voltage: 5VDC; Coil Type: Non Latching; Turn Off Voltage (Min): 0.25 VDC; Coil Power: 400 mW; Features: Insulation - Class F, Sealed - Flux Protection; Packaging: Tray; Part Status: Active; Contact Material: Silver Alloy; Operating Temperature: -40°C ~ 105°C; Termination Style: PC Pin; Manufacturer Part Number: G5Q-1 DC5; RoHS: RoHS Compliant; Category: Relays; Supplier: Digi-Key; Mounting Type: Through Hole; ComponentLink1URL: http://omronfs.omron.com/en_US/ecb/products/pdf/en-g5q.pdf; ComponentLink1Description: http://omronfs.omron.com/en_US/ecb/products/pdf/en-g5q.pdf; Pricing: 500=0.89596 (USD); Supplier Part Number: G5Q-1DC5-ND
footprint RELAY__G5Q-1
pins: 1, 2, 3, 4, 5

## RELAY__G6SK-2 DC3
designator K?, comment G6SK-2-DC3
Telecom Relay DPDT (2 Form C) Through Hole; Manufacturer: Omron; Contact Current Rating: 2A; Coil Current: 66.7mA; Operate Time: 4ms; Coil Power: 200mW; Coil Resistance: 45R; Coil Type: Latching, Dual Coil; Coil Voltage (DC): 3V; Max Voltage Rating (AC): 250V; Max Voltage Rating (DC): 220V; Supplier 1: Avnet; Manufacturer Part Number: G6SK-2-DC3; Stock 1: 0; Pricing 1: 1000=2.6926, 2000=2.6078, 4000=2.4853, 6000=2.4153, 8000=2.3278, 10000=2.2578, 100000=2.1878 (USD); Mount: Through Hole; Case/Package: DIP; Number of Pins: 8; Contact Material: Gold,Silver; Weight: 2g; Min Operating Temperature: -40°C; Max Operating Temperature: 70°C; Package Quantity: 50; Packaging: Rail/Tube; Termination: PC Pin; Throw Configuration: DPDT; Release Time: 4ms; Relay Type: Telecom; Max Current Rating: 2A; Power Consumption: 200mW; Series: G6S; Radiation Hardening: No; ComponentLink1URL: http://www.components.omron.com/components/web/PDFLIB.nsf/0/3AB780E03885359085257201007DD68A/$file/G6S_1012.pdf?src-supplier=Mouser; ComponentLink1Description: http://www.components.omron.com/components/web/PDFLIB.nsf/0/3AB780E03885359085257201007DD68A/$file/G6S_1012.pdf?src-supplier=Mouser; ComponentLink2URL: http://www.components.omron.com/components/web/PDFLIB.nsf/0/3AB780E03885359085257201007DD68A/$file/G6S_0514.pdf?src-supplier=Digi-Key; ComponentLink2Description: http://www.components.omron.com/components/web/PDFLIB.nsf/0/3AB780E03885359085257201007DD68A/$file/G6S_0514.pdf?src-supplier=Digi-Key; Supplier Part Number 1: G6SK2DC3BYOMZ
footprint G6SK-2
pins: 1 T1 (in), 3 NC_1, 4 COM_1, 5 NO_1, 6 T1 (in), 7 T2, 8 NO_2, 9 COM_2, 10 NC_2, 12 T2
text: SET; RESET

## RELAY__PCH-105L2M,000
designator K?, comment PCH-105L2M,000
RELAY GEN PURPOSE SPST 5A 5V; Manufacturer: TE Connectivity / OEG; Coil Type: Non-Latching; Coil Voltage: 5 VDC; Contact Form: SPST (1 Form A); Contact Termination: Solder Pin; Power Consumption: 200 mW; Coil Resistance: 125 Ohms; Relay Contact Form: 1 Form A (SPST-NO); Switching Voltage: 277 VAC, 30 VDC; Supplier 1: Mouser; Manufacturer Part Number: PCH-105L2M,000; RoHS: RoHS Compliant; Category: General Purpose Relays; Stock 1: 498; Pricing 1: 1=2.02, 10=1.89, 50=1.60, 100=1.51, 200=1.34, 500=1.26, 1000=1.17, 2500=1.15, 5000=1.13 (USD); Height: 15.2 mm; Length: 20 mm; Product: Power Relays; Series: PCH; Type: Miniature; Width: 10 mm; Brand: TE Connectivity / OEG; Contact Current Rating: 5 A; Mounting Style: Through Hole; Product Type: General Purpose Relays; Standard Pack Qty: 100; Subcategory: Relays; RoHS - Mouser: Y; Minimum Order Quantity: 1; Reeling: False; ComponentLink1URL: https://www.mouser.com/datasheet/2/418/NG_CD_1461352_H1-648901.pdf; ComponentLink1Description: https://www.mouser.com/datasheet/2/418/NG_CD_1461352_H1-648901.pdf; Supplier Part Number 1: 655-PCH-105L2M000
footprint RELAY__PCH-105L2M,000
pins: 1 T1, 2 T2, 3 COM, 4 NO
